# Altium footprint library RES_TH.PcbLib: 94 footprints (part 3 of 6)
Each footprint in its own frame and in the unit in brackets; x right, y up, seen from the top. Pads: shape width x height; smd on the part's side, far side on the other; paste and mask are expansions set on the pad; w line width, h text height; cw(c..) or ccw(c..) is an arc to the next point about the centre after c.
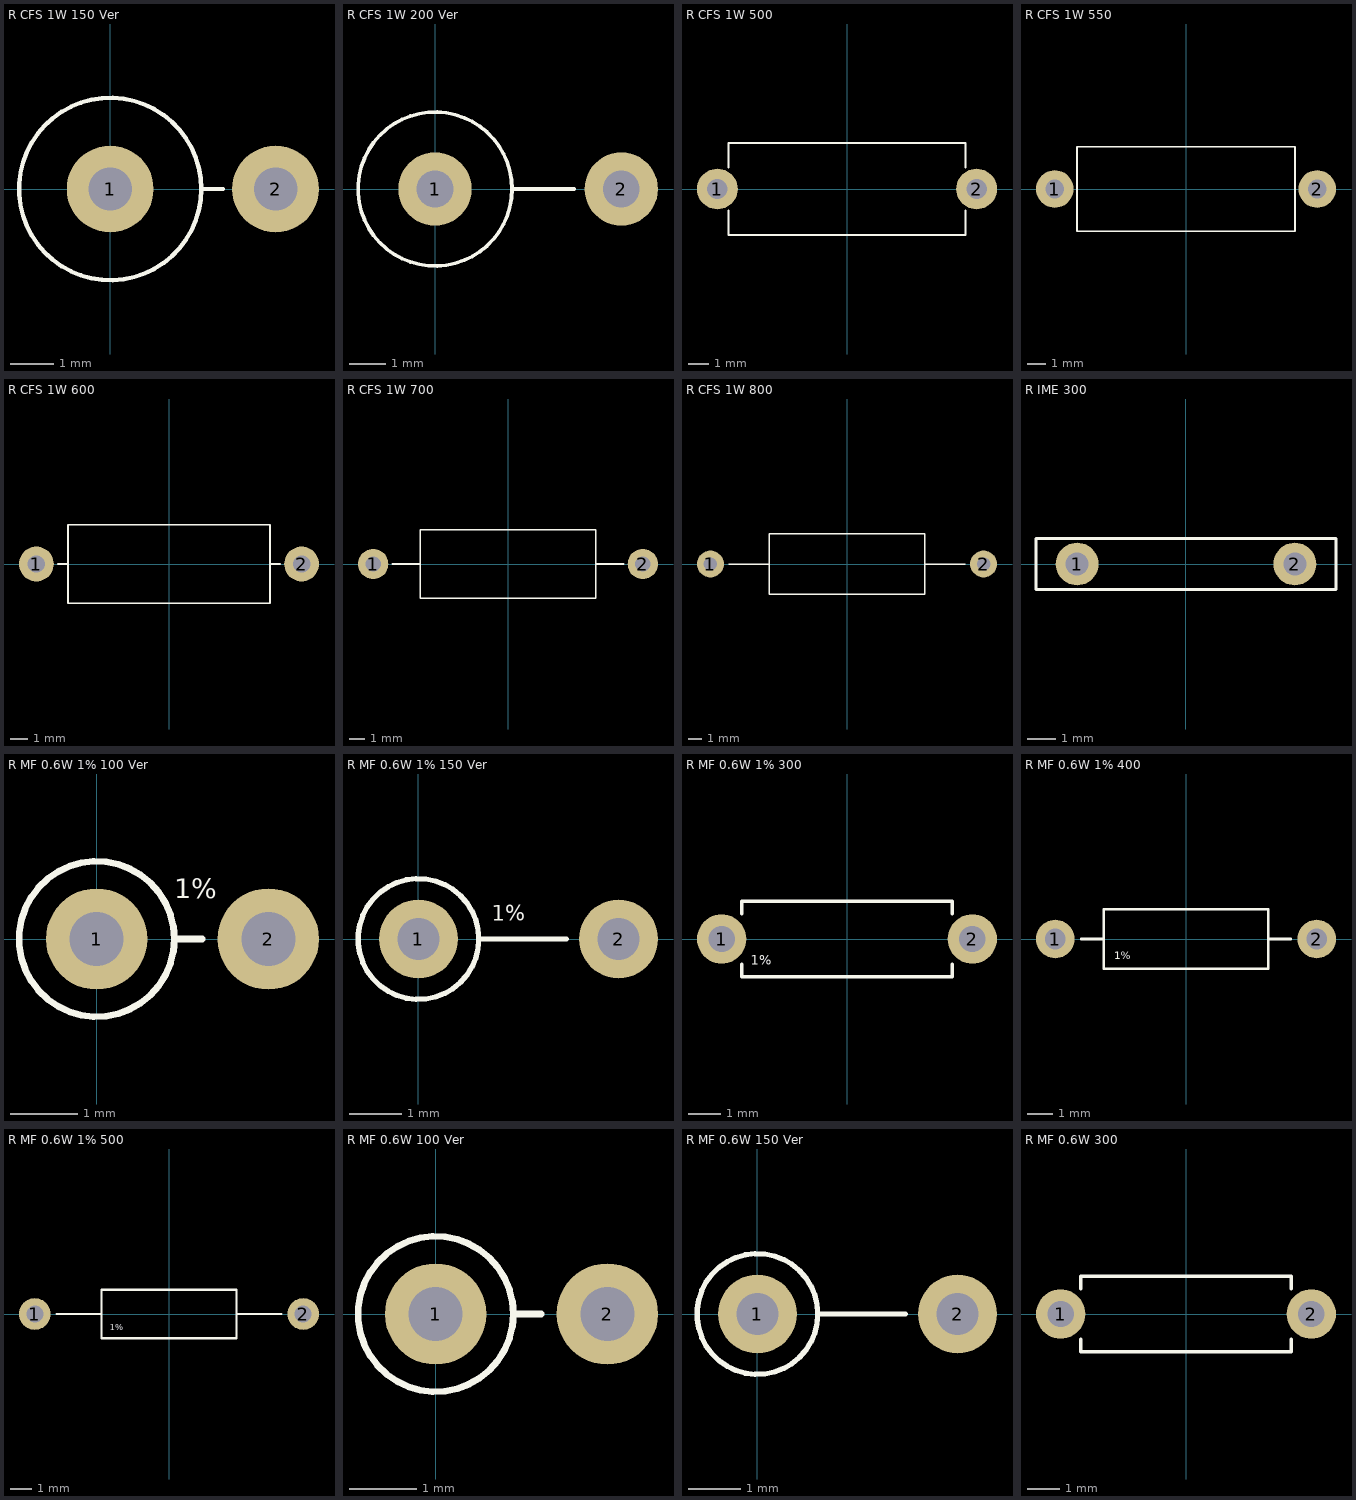
[diagram p2: the footprints below, top view; thin cyan lines are the x and y axes]

## R CFS 1W 150 Ver [mm]
pads (2):
  round 2 hole 1: 1(0,0) 2(3.81,0)
Top Overlay:
  circle w0.1: c0,0 r2.1
  lines w0.1: 2.159,0 2.6,0
3D body "R1W CFS 150 Ver.STEP": height 14.71, standoff -2.03, extent -2.1,-2.1 4.11,2.1

## R CFS 1W 200 Ver [mm]
pads (2):
  round 2 hole 1: 1(0,0) 2(5.08,0)
Top Overlay:
  circle w0.1: c0,0 r2.1
  lines w0.1: 2.159,0 3.8,0
3D body "R1W CFS 200 Ver.STEP": height 15.35, standoff -2.03, extent -2.1,-2.1 5.38,2.1

## R CFS 1W 500 [mm]
pads (2):
  round 2 hole 1: 1(-6.35,0) 2(6.35,0)
Top Overlay:
  lines w0.1: -5.8,-1.05 -5.8,-2.25 5.8,-2.25 5.8,-1.05 ; -5.8,1.05 -5.8,2.25 5.8,2.25 5.8,1.05
3D body "R1W CFS 500.SLDPRT": height 4.5, standoff -2.54, extent -6.648,-2.25 6.648,2.25

## R CFS 1W 550 [mm]
pads (2):
  round 2 hole 1: 1(-6.985,0) 2(6.985,0)
Top Overlay:
  lines w0.1: -5.8,-2.25 5.8,-2.25 5.8,2.25 -5.8,2.25 -5.8,-2.25
3D body "R1W CFS 550.SLDPRT": height 4.5, standoff -2.54, extent -7.283,-2.25 7.283,2.25

## R CFS 1W 600 [mm]
pads (2):
  round 2 hole 1: 1(-7.62,0) 2(7.62,0)
Top Overlay:
  lines w0.1: -6.4,0 -5.8,0 ; 5.8,0 6.4,0 ; -5.8,-2.25 5.8,-2.25 5.8,2.25 -5.8,2.25 -5.8,-2.25
3D body "R1W CFS 600.SLDPRT": height 4.5, standoff -2.54, extent -7.918,-2.25 7.918,2.25

## R CFS 1W 700 [mm]
pads (2):
  round 2 hole 1: 1(-8.89,0) 2(8.89,0)
Top Overlay:
  lines w0.1: -7.62,0 -5.8,0 ; 5.8,0 7.62,0 ; -5.8,-2.25 -5.8,2.25 5.8,2.25 5.8,-2.25 -5.8,-2.25
3D body "R1W CFS 700.SLDPRT": height 4.5, standoff -2.54, extent -9.188,-2.25 9.188,2.25

## R CFS 1W 800 [mm]
pads (2):
  round 2 hole 1: 1(-10.16,0) 2(10.16,0)
Top Overlay:
  lines w0.1: -8.8,0 -5.8,0 ; 5.8,0 8.8,0 ; -5.8,-2.25 -5.8,2.25 5.8,2.25 5.8,-2.25 -5.8,-2.25
3D body "R1W CFS 800.SLDPRT": height 4.5, standoff -2.54, extent -10.458,-2.25 10.458,2.25

## R IME 300 [mm]
pads (2):
  round 1.5 hole 0.8: 1(-3.81,0) 2(3.81,0)
Top Overlay:
  lines w0.1: -5.25,-0.889 5.25,-0.889 5.25,0.889 -5.25,0.889 -5.25,-0.889
3D body "RM2-300.STEP": height 8.55, standoff -2.5, extent -5.25,-0.8 5.25,0.8

## R MF 0.6W 1% 100 Ver [mm]
pads (2):
  round 1.5 hole 0.8: 1(0,0) 2(2.54,0)
Top Overlay:
  circle w0.1: c0,0 r1.15
  lines w0.1: 1.15,0 1.562,0
  text "1%" at 1.15,0.508 h0.5
3D body "R0.6W 1% 100 Ver.STEP": height 8.07, standoff -2.54, extent -1.15,-1.15 2.84,1.15

## R MF 0.6W 1% 150 Ver [mm]
pads (2):
  round 1.5 hole 0.8: 1(0,0) 2(3.81,0)
Top Overlay:
  circle w0.1: c0,0 r1.15
  lines w0.1: 1.15,0 2.812,0
  text "1%" at 1.397,0.254 h0.5
3D body "R0.6W 1% 150 Ver.STEP": height 8.7, standoff -2.54, extent -1.15,-1.15 4.11,1.15

## R MF 0.6W 1% 300 [mm]
pads (2):
  round 1.5 hole 0.8: 1(-3.81,0) 2(3.81,0)
Top Overlay:
  lines w0.1: -3.2,-0.762 -3.2,-1.15 3.2,-1.15 3.2,-0.762 ; -3.2,0.762 -3.2,1.15 3.2,1.15 3.2,0.762
  text "1%" at -2.921,-0.889 h0.5
3D body "R0.6W 1% 300.STEP": height 2.3, standoff -2.54, extent -4.11,-1.15 4.11,1.15

## R MF 0.6W 1% 400 [mm]
pads (2):
  round 1.5 hole 0.8: 1(-5.08,0) 2(5.08,0)
Top Overlay:
  lines w0.1: -4.064,0 -3.2,0 ; 3.2,0 4.064,0 ; -3.2,-1.15 3.2,-1.15 3.2,1.15 -3.2,1.15 -3.2,-1.15
  text "1%" at -2.794,-0.889 h0.5
3D body "R0.6W 1% 400.SLDPRT": height 2.3, standoff -2.54, extent -5.378,-1.15 5.378,1.15

## R MF 0.6W 1% 500 [mm]
pads (2):
  round 1.5 hole 0.8: 1(-6.35,0) 2(6.35,0)
Top Overlay:
  lines w0.1: -5.334,0 -3.2,0 ; 3.2,0 5.334,0 ; -3.2,-1.15 3.2,-1.15 3.2,1.15 -3.2,1.15 -3.2,-1.15
  text "1%" at -2.794,-0.889 h0.5
3D body "R0.6W 1% 500.SLDPRT": height 2.3, standoff -2.54, extent -6.648,-1.15 6.648,1.15

## R MF 0.6W 100 Ver [mm]
pads (2):
  round 1.5 hole 0.8: 1(0,0) 2(2.54,0)
Top Overlay:
  circle w0.1: c0,0 r1.15
  lines w0.1: 1.15,0 1.562,0
3D body "R0.6W 1% 100 Ver.STEP": height 8.07, standoff -2.54, extent -1.15,-1.15 2.84,1.15

## R MF 0.6W 150 Ver [mm]
pads (2):
  round 1.5 hole 0.8: 1(0,0) 2(3.81,0)
Top Overlay:
  circle w0.1: c0,0 r1.15
  lines w0.1: 1.15,0 2.812,0
3D body "R0.6W 1% 150 Ver.STEP": height 8.7, standoff -2.54, extent -1.15,-1.15 4.11,1.15

## R MF 0.6W 300 [mm]
pads (2):
  round 1.5 hole 0.8: 1(-3.81,0) 2(3.81,0)
Top Overlay:
  lines w0.1: -3.2,-0.762 -3.2,-1.15 3.2,-1.15 3.2,-0.762 ; -3.2,0.762 -3.2,1.15 3.2,1.15 3.2,0.762
3D body "R0.6W 1% 300.STEP": height 2.3, standoff -2.54, extent -4.11,-1.15 4.11,1.15